# Altium footprint library Basal.PcbLib: 248 footprints (part 10 of 16)
Each footprint in its own frame and in the unit in brackets; x right, y up, seen from the top. Pads: shape width x height; smd on the part's side, far side on the other; paste and mask are expansions set on the pad; w line width, h text height; cw(c..) or ccw(c..) is an arc to the next point about the centre after c.
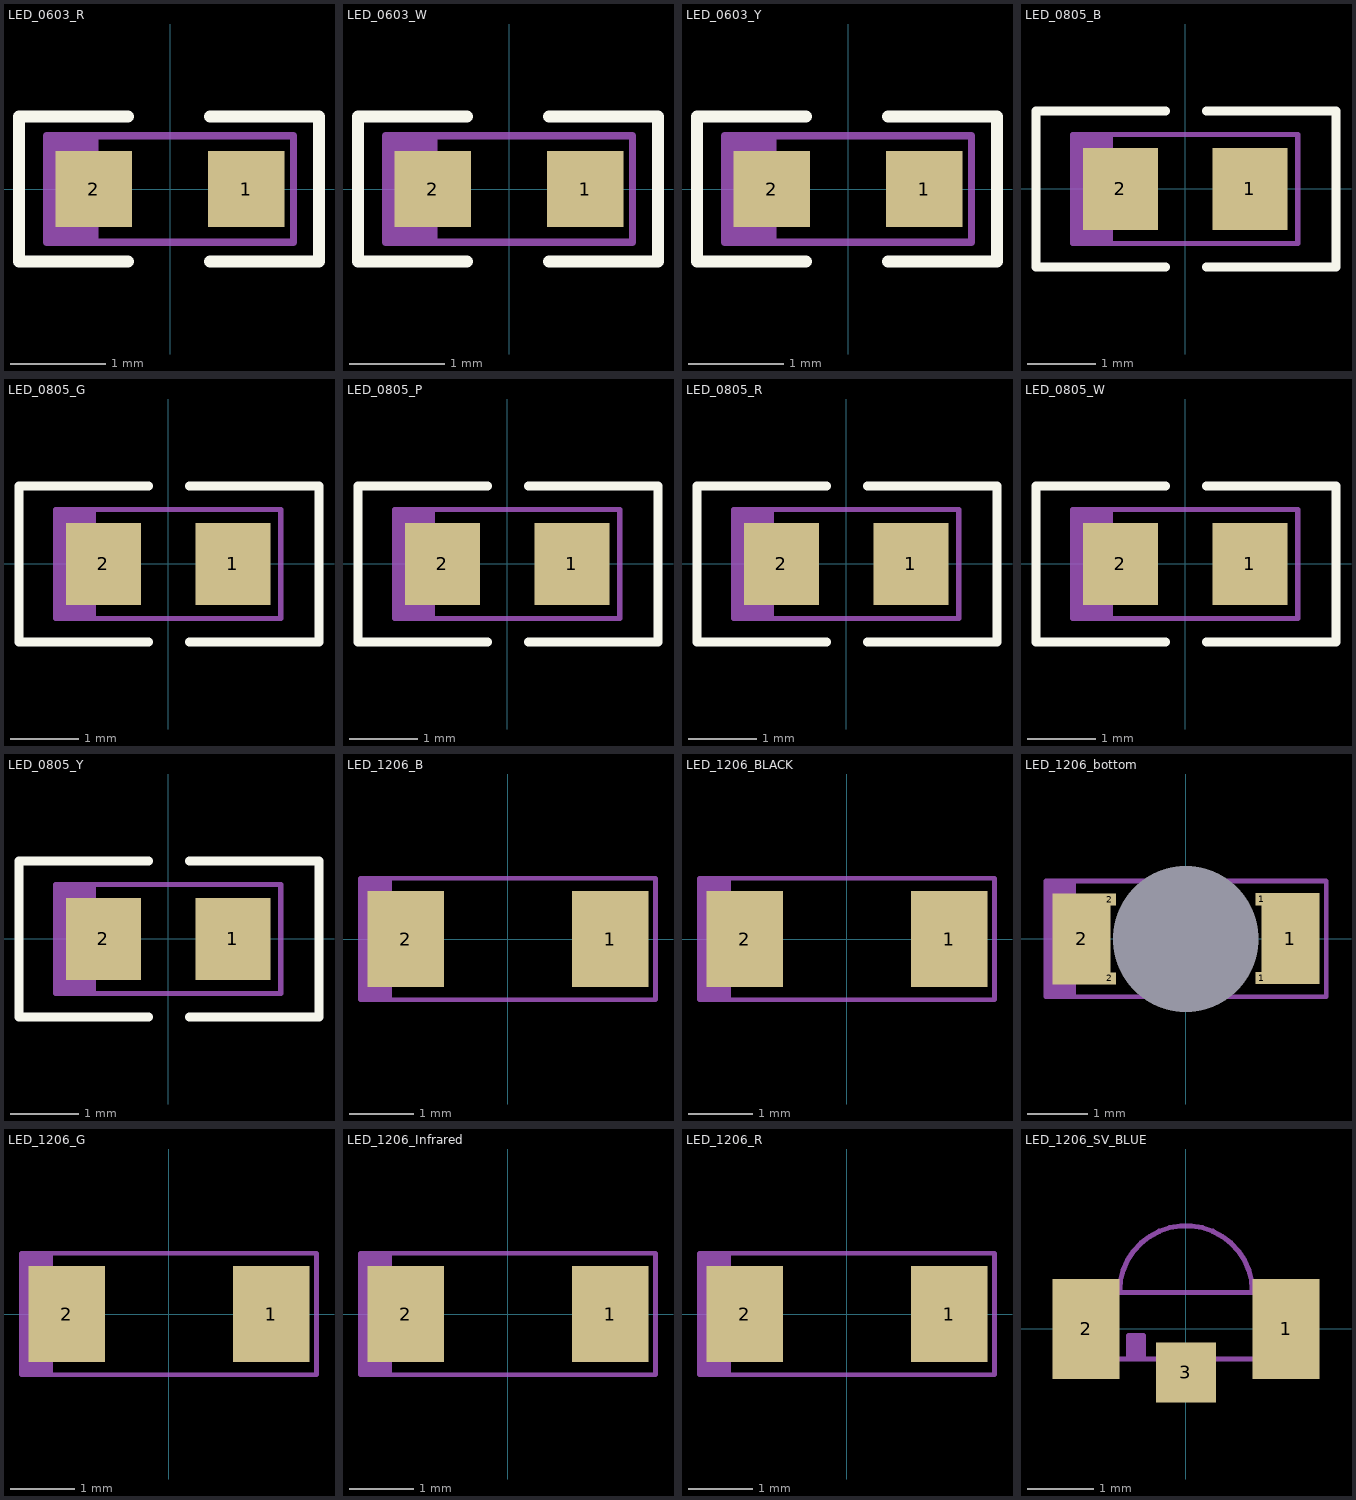
[diagram p9: the footprints below, top view; thin cyan lines are the x and y axes]

## LED_0603_R [mm] "红色贴片0603LED"
pads (2):
  rect 0.8x0.8 smd paste-1: 1(0.8,0) 2(-0.8,0)
Top Overlay:
  lines w0.127: -0.443,-0.762 -1.586,-0.762 -1.586,0.762 -0.443,0.762 ; 0.421,-0.762 1.564,-0.762 1.564,0.762 0.421,0.762
Top Paste:
  region: 0.419,0.15 0.719,0.368 1.169,0.368 1.169,-0.368 0.719,-0.368 0.419,-0.15
  region: -0.419,-0.15 -0.719,-0.368 -1.169,-0.368 -1.169,0.368 -0.719,0.368 -0.419,0.15
Mechanical 15:
  lines w0.076: -1.245,-0.559 -1.245,0.559 ; -1.194,-0.559 -1.194,0.559 ; -1.143,-0.559 -1.143,0.559 ; -1.092,-0.559 -1.092,0.559 ; -1.041,-0.559 -1.041,0.559 ; -0.991,-0.559 -0.991,0.559 ; -0.94,-0.559 -0.94,0.559 ; -0.889,-0.559 -0.889,0.559 ; -0.838,-0.559 -0.838,0.559 ; -0.787,-0.559 -0.787,0.559 ; -1.295,-0.559 -1.295,0.559 1.295,0.559 1.295,-0.559 -1.295,-0.559
3D body "RED0603.STEP": height 0.8, standoff 0, extent -0.8,-0.4 0.8,0.4

## LED_0603_W [mm] "白色贴片0603LED"
pads (2):
  rect 0.8x0.8 smd paste-1: 1(0.8,0) 2(-0.8,0)
Top Overlay:
  lines w0.127: -0.443,-0.762 -1.586,-0.762 -1.586,0.762 -0.443,0.762 ; 0.421,-0.762 1.564,-0.762 1.564,0.762 0.421,0.762
Top Paste:
  region: -0.419,-0.15 -0.719,-0.368 -1.169,-0.368 -1.169,0.368 -0.719,0.368 -0.419,0.15
  region: 0.419,0.15 0.719,0.368 1.169,0.368 1.169,-0.368 0.719,-0.368 0.419,-0.15
Mechanical 15:
  lines w0.076: -1.245,-0.559 -1.245,0.559 ; -1.194,-0.559 -1.194,0.559 ; -1.143,-0.559 -1.143,0.559 ; -1.092,-0.559 -1.092,0.559 ; -1.041,-0.559 -1.041,0.559 ; -0.991,-0.559 -0.991,0.559 ; -0.94,-0.559 -0.94,0.559 ; -0.889,-0.559 -0.889,0.559 ; -0.838,-0.559 -0.838,0.559 ; -0.787,-0.559 -0.787,0.559 ; -1.295,-0.559 -1.295,0.559 1.295,0.559 1.295,-0.559 -1.295,-0.559
3D body "WHITE0603.STEP": height 0.8, standoff 0, extent -0.8,-0.4 0.8,0.4

## LED_0603_Y [mm] "黄色贴片0603LED"
pads (2):
  rect 0.8x0.8 smd paste-1: 1(0.8,0) 2(-0.8,0)
Top Overlay:
  lines w0.127: -0.443,-0.762 -1.586,-0.762 -1.586,0.762 -0.443,0.762 ; 0.421,-0.762 1.564,-0.762 1.564,0.762 0.421,0.762
Top Paste:
  region: -0.419,-0.15 -0.719,-0.368 -1.169,-0.368 -1.169,0.368 -0.719,0.368 -0.419,0.15
  region: 0.419,0.15 0.719,0.368 1.169,0.368 1.169,-0.368 0.719,-0.368 0.419,-0.15
Mechanical 15:
  lines w0.076: -1.245,-0.559 -1.245,0.559 ; -1.194,-0.559 -1.194,0.559 ; -1.143,-0.559 -1.143,0.559 ; -1.092,-0.559 -1.092,0.559 ; -1.041,-0.559 -1.041,0.559 ; -0.991,-0.559 -0.991,0.559 ; -0.94,-0.559 -0.94,0.559 ; -0.889,-0.559 -0.889,0.559 ; -0.838,-0.559 -0.838,0.559 ; -0.787,-0.559 -0.787,0.559 ; -1.295,-0.559 -1.295,0.559 1.295,0.559 1.295,-0.559 -1.295,-0.559
3D body "YELLOW0603.STEP": height 0.8, standoff 0, extent -0.8,-0.4 0.8,0.4

## LED_0805_B [mm] "蓝色贴片0805LED"
pads (2):
  rect 1.1x1.2 smd paste-2: 1(0.95,0) 2(-0.95,0)
Top Overlay:
  lines w0.127: -0.282,-1.143 -2.187,-1.143 -2.187,1.143 -0.282,1.143 ; 0.307,-1.143 2.212,-1.143 2.212,1.143 0.307,1.143
Top Paste:
  region: 0.452,0.459 0.452,0.479 0.467,0.515 0.496,0.544 0.532,0.559 0.552,0.559 1.348,0.559 1.368,0.559 1.404,0.544 1.433,0.515 1.448,0.479 1.448,0.459 1.448,-0.459 1.448,-0.479 1.433,-0.515 1.404,-0.544 1.368,-0.559 1.348,-0.559 0.552,-0.559 0.532,-0.559 0.496,-0.544 0.467,-0.515 0.452,-0.479 0.452,-0.459 0.452,-0.3 0.452,-0.28 0.467,-0.243 0.496,-0.215 0.532,-0.2 0.552,-0.2 0.648,-0.2 0.687,-0.196 0.759,-0.166 0.814,-0.111 0.844,-0.039 0.844,0.039 0.814,0.111 0.759,0.166 0.687,0.196 0.648,0.2 0.552,0.2 0.532,0.2 0.496,0.215 0.467,0.243 0.452,0.28 0.452,0.3
  region: -0.452,-0.459 -0.452,-0.479 -0.467,-0.515 -0.496,-0.544 -0.532,-0.559 -0.552,-0.559 -1.348,-0.559 -1.368,-0.559 -1.404,-0.544 -1.433,-0.515 -1.448,-0.479 -1.448,-0.459 -1.448,0.459 -1.448,0.479 -1.433,0.515 -1.404,0.544 -1.368,0.559 -1.348,0.559 -0.552,0.559 -0.532,0.559 -0.496,0.544 -0.467,0.515 -0.452,0.479 -0.452,0.459 -0.452,0.3 -0.452,0.28 -0.467,0.243 -0.496,0.215 -0.532,0.2 -0.552,0.2 -0.648,0.2 -0.687,0.196 -0.759,0.166 -0.814,0.111 -0.844,0.039 -0.844,-0.039 -0.814,-0.111 -0.759,-0.166 -0.687,-0.196 -0.648,-0.2 -0.552,-0.2 -0.532,-0.2 -0.496,-0.215 -0.467,-0.243 -0.452,-0.28 -0.452,-0.3
Mechanical 15:
  lines w0.076: -1.6,-0.8 -1.6,0.8 ; -1.549,-0.8 -1.549,0.8 ; -1.499,-0.8 -1.499,0.8 ; -1.448,-0.8 -1.448,0.8 ; -1.397,-0.8 -1.397,0.8 ; -1.346,-0.8 -1.346,0.8 ; -1.295,-0.8 -1.295,0.8 ; -1.245,-0.8 -1.245,0.8 ; -1.194,-0.8 -1.194,0.8 ; -1.143,-0.8 -1.143,0.8 ; -1.092,-0.8 -1.092,0.8 ; -1.651,-0.8 1.651,-0.8 1.651,0.8 -1.651,0.8 -1.651,-0.8
3D body "BLUE0805.STEP": height 0.81, standoff 0.01, extent -0.987,-0.625 1.013,0.625

## LED_0805_G [mm] "绿色贴片0805LED"
pads (2):
  rect 1.1x1.2 smd paste-2: 1(0.95,0) 2(-0.95,0)
Top Overlay:
  lines w0.127: -0.282,-1.143 -2.187,-1.143 -2.187,1.143 -0.282,1.143 ; 0.307,-1.143 2.212,-1.143 2.212,1.143 0.307,1.143
Top Paste:
  region: 0.452,0.459 0.452,0.479 0.467,0.515 0.496,0.544 0.532,0.559 0.552,0.559 1.348,0.559 1.368,0.559 1.404,0.544 1.433,0.515 1.448,0.479 1.448,0.459 1.448,-0.459 1.448,-0.479 1.433,-0.515 1.404,-0.544 1.368,-0.559 1.348,-0.559 0.552,-0.559 0.532,-0.559 0.496,-0.544 0.467,-0.515 0.452,-0.479 0.452,-0.459 0.452,-0.3 0.452,-0.28 0.467,-0.243 0.496,-0.215 0.532,-0.2 0.552,-0.2 0.648,-0.2 0.687,-0.196 0.759,-0.166 0.814,-0.111 0.844,-0.039 0.844,0.039 0.814,0.111 0.759,0.166 0.687,0.196 0.648,0.2 0.552,0.2 0.532,0.2 0.496,0.215 0.467,0.243 0.452,0.28 0.452,0.3
  region: -0.452,-0.459 -0.452,-0.479 -0.467,-0.515 -0.496,-0.544 -0.532,-0.559 -0.552,-0.559 -1.348,-0.559 -1.368,-0.559 -1.404,-0.544 -1.433,-0.515 -1.448,-0.479 -1.448,-0.459 -1.448,0.459 -1.448,0.479 -1.433,0.515 -1.404,0.544 -1.368,0.559 -1.348,0.559 -0.552,0.559 -0.532,0.559 -0.496,0.544 -0.467,0.515 -0.452,0.479 -0.452,0.459 -0.452,0.3 -0.452,0.28 -0.467,0.243 -0.496,0.215 -0.532,0.2 -0.552,0.2 -0.648,0.2 -0.687,0.196 -0.759,0.166 -0.814,0.111 -0.844,0.039 -0.844,-0.039 -0.814,-0.111 -0.759,-0.166 -0.687,-0.196 -0.648,-0.2 -0.552,-0.2 -0.532,-0.2 -0.496,-0.215 -0.467,-0.243 -0.452,-0.28 -0.452,-0.3
Mechanical 15:
  lines w0.076: -1.6,-0.8 -1.6,0.8 ; -1.549,-0.8 -1.549,0.8 ; -1.499,-0.8 -1.499,0.8 ; -1.448,-0.8 -1.448,0.8 ; -1.397,-0.8 -1.397,0.8 ; -1.346,-0.8 -1.346,0.8 ; -1.295,-0.8 -1.295,0.8 ; -1.245,-0.8 -1.245,0.8 ; -1.194,-0.8 -1.194,0.8 ; -1.143,-0.8 -1.143,0.8 ; -1.092,-0.8 -1.092,0.8 ; -1.651,-0.8 -1.651,0.8 1.651,0.8 1.651,-0.8 -1.651,-0.8
3D body "GREEN0805.STEP": height 0.81, standoff 0.01, extent -1,-0.625 1,0.625

## LED_0805_P [mm] "紫色贴片0805LED"
pads (2):
  rect 1.1x1.2 smd paste-2: 1(0.95,0) 2(-0.95,0)
Top Overlay:
  lines w0.127: -0.282,-1.143 -2.187,-1.143 -2.187,1.143 -0.282,1.143 ; 0.307,-1.143 2.212,-1.143 2.212,1.143 0.307,1.143
Top Paste:
  region: 0.452,0.459 0.452,0.479 0.467,0.515 0.496,0.544 0.532,0.559 0.552,0.559 1.348,0.559 1.368,0.559 1.404,0.544 1.433,0.515 1.448,0.479 1.448,0.459 1.448,-0.459 1.448,-0.479 1.433,-0.515 1.404,-0.544 1.368,-0.559 1.348,-0.559 0.552,-0.559 0.532,-0.559 0.496,-0.544 0.467,-0.515 0.452,-0.479 0.452,-0.459 0.452,-0.3 0.452,-0.28 0.467,-0.243 0.496,-0.215 0.532,-0.2 0.552,-0.2 0.648,-0.2 0.687,-0.196 0.759,-0.166 0.814,-0.111 0.844,-0.039 0.844,0.039 0.814,0.111 0.759,0.166 0.687,0.196 0.648,0.2 0.552,0.2 0.532,0.2 0.496,0.215 0.467,0.243 0.452,0.28 0.452,0.3
  region: -0.452,-0.459 -0.452,-0.479 -0.467,-0.515 -0.496,-0.544 -0.532,-0.559 -0.552,-0.559 -1.348,-0.559 -1.368,-0.559 -1.404,-0.544 -1.433,-0.515 -1.448,-0.479 -1.448,-0.459 -1.448,0.459 -1.448,0.479 -1.433,0.515 -1.404,0.544 -1.368,0.559 -1.348,0.559 -0.552,0.559 -0.532,0.559 -0.496,0.544 -0.467,0.515 -0.452,0.479 -0.452,0.459 -0.452,0.3 -0.452,0.28 -0.467,0.243 -0.496,0.215 -0.532,0.2 -0.552,0.2 -0.648,0.2 -0.687,0.196 -0.759,0.166 -0.814,0.111 -0.844,0.039 -0.844,-0.039 -0.814,-0.111 -0.759,-0.166 -0.687,-0.196 -0.648,-0.2 -0.552,-0.2 -0.532,-0.2 -0.496,-0.215 -0.467,-0.243 -0.452,-0.28 -0.452,-0.3
Mechanical 15:
  lines w0.076: -1.6,-0.8 -1.6,0.8 ; -1.549,-0.8 -1.549,0.8 ; -1.499,-0.8 -1.499,0.8 ; -1.448,-0.8 -1.448,0.8 ; -1.397,-0.8 -1.397,0.8 ; -1.346,-0.8 -1.346,0.8 ; -1.295,-0.8 -1.295,0.8 ; -1.245,-0.8 -1.245,0.8 ; -1.194,-0.8 -1.194,0.8 ; -1.143,-0.8 -1.143,0.8 ; -1.092,-0.8 -1.092,0.8 ; -1.651,-0.8 1.651,-0.8 1.651,0.8 -1.651,0.8 -1.651,-0.8
3D body "PINK0805.STEP": height 0.81, standoff 0.01, extent -1,-0.625 1,0.625

## LED_0805_R [mm] "红色贴片0805LED"
pads (2):
  rect 1.1x1.2 smd paste-2: 1(0.95,0) 2(-0.95,0)
Top Overlay:
  lines w0.127: -0.282,-1.143 -2.187,-1.143 -2.187,1.143 -0.282,1.143 ; 0.307,-1.143 2.212,-1.143 2.212,1.143 0.307,1.143
Top Paste:
  region: 0.452,0.459 0.452,0.479 0.467,0.515 0.496,0.544 0.532,0.559 0.552,0.559 1.348,0.559 1.368,0.559 1.404,0.544 1.433,0.515 1.448,0.479 1.448,0.459 1.448,-0.459 1.448,-0.479 1.433,-0.515 1.404,-0.544 1.368,-0.559 1.348,-0.559 0.552,-0.559 0.532,-0.559 0.496,-0.544 0.467,-0.515 0.452,-0.479 0.452,-0.459 0.452,-0.3 0.452,-0.28 0.467,-0.243 0.496,-0.215 0.532,-0.2 0.552,-0.2 0.648,-0.2 0.687,-0.196 0.759,-0.166 0.814,-0.111 0.844,-0.039 0.844,0.039 0.814,0.111 0.759,0.166 0.687,0.196 0.648,0.2 0.552,0.2 0.532,0.2 0.496,0.215 0.467,0.243 0.452,0.28 0.452,0.3
  region: -0.452,-0.459 -0.452,-0.479 -0.467,-0.515 -0.496,-0.544 -0.532,-0.559 -0.552,-0.559 -1.348,-0.559 -1.368,-0.559 -1.404,-0.544 -1.433,-0.515 -1.448,-0.479 -1.448,-0.459 -1.448,0.459 -1.448,0.479 -1.433,0.515 -1.404,0.544 -1.368,0.559 -1.348,0.559 -0.552,0.559 -0.532,0.559 -0.496,0.544 -0.467,0.515 -0.452,0.479 -0.452,0.459 -0.452,0.3 -0.452,0.28 -0.467,0.243 -0.496,0.215 -0.532,0.2 -0.552,0.2 -0.648,0.2 -0.687,0.196 -0.759,0.166 -0.814,0.111 -0.844,0.039 -0.844,-0.039 -0.814,-0.111 -0.759,-0.166 -0.687,-0.196 -0.648,-0.2 -0.552,-0.2 -0.532,-0.2 -0.496,-0.215 -0.467,-0.243 -0.452,-0.28 -0.452,-0.3
Mechanical 15:
  lines w0.076: -1.6,-0.8 -1.6,0.8 ; -1.549,-0.8 -1.549,0.8 ; -1.499,-0.8 -1.499,0.8 ; -1.448,-0.8 -1.448,0.8 ; -1.397,-0.8 -1.397,0.8 ; -1.346,-0.8 -1.346,0.8 ; -1.295,-0.8 -1.295,0.8 ; -1.245,-0.8 -1.245,0.8 ; -1.194,-0.8 -1.194,0.8 ; -1.143,-0.8 -1.143,0.8 ; -1.092,-0.8 -1.092,0.8 ; -1.651,-0.8 -1.651,0.8 1.651,0.8 1.651,-0.8 -1.651,-0.8
3D body "RED0805.STEP": height 0.81, standoff 0.01, extent -1,-0.625 1,0.625

## LED_0805_W [mm] "白色贴片0805LED"
pads (2):
  rect 1.1x1.2 smd paste-2: 1(0.95,0) 2(-0.95,0)
Top Overlay:
  lines w0.127: -0.282,-1.143 -2.187,-1.143 -2.187,1.143 -0.282,1.143 ; 0.307,-1.143 2.212,-1.143 2.212,1.143 0.307,1.143
Top Paste:
  region: 0.452,0.459 0.452,0.479 0.467,0.515 0.496,0.544 0.532,0.559 0.552,0.559 1.348,0.559 1.368,0.559 1.404,0.544 1.433,0.515 1.448,0.479 1.448,0.459 1.448,-0.459 1.448,-0.479 1.433,-0.515 1.404,-0.544 1.368,-0.559 1.348,-0.559 0.552,-0.559 0.532,-0.559 0.496,-0.544 0.467,-0.515 0.452,-0.479 0.452,-0.459 0.452,-0.3 0.452,-0.28 0.467,-0.243 0.496,-0.215 0.532,-0.2 0.552,-0.2 0.648,-0.2 0.687,-0.196 0.759,-0.166 0.814,-0.111 0.844,-0.039 0.844,0.039 0.814,0.111 0.759,0.166 0.687,0.196 0.648,0.2 0.552,0.2 0.532,0.2 0.496,0.215 0.467,0.243 0.452,0.28 0.452,0.3
  region: -0.452,-0.459 -0.452,-0.479 -0.467,-0.515 -0.496,-0.544 -0.532,-0.559 -0.552,-0.559 -1.348,-0.559 -1.368,-0.559 -1.404,-0.544 -1.433,-0.515 -1.448,-0.479 -1.448,-0.459 -1.448,0.459 -1.448,0.479 -1.433,0.515 -1.404,0.544 -1.368,0.559 -1.348,0.559 -0.552,0.559 -0.532,0.559 -0.496,0.544 -0.467,0.515 -0.452,0.479 -0.452,0.459 -0.452,0.3 -0.452,0.28 -0.467,0.243 -0.496,0.215 -0.532,0.2 -0.552,0.2 -0.648,0.2 -0.687,0.196 -0.759,0.166 -0.814,0.111 -0.844,0.039 -0.844,-0.039 -0.814,-0.111 -0.759,-0.166 -0.687,-0.196 -0.648,-0.2 -0.552,-0.2 -0.532,-0.2 -0.496,-0.215 -0.467,-0.243 -0.452,-0.28 -0.452,-0.3
Mechanical 15:
  lines w0.076: -1.6,-0.8 -1.6,0.8 ; -1.549,-0.8 -1.549,0.8 ; -1.499,-0.8 -1.499,0.8 ; -1.448,-0.8 -1.448,0.8 ; -1.397,-0.8 -1.397,0.8 ; -1.346,-0.8 -1.346,0.8 ; -1.295,-0.8 -1.295,0.8 ; -1.245,-0.8 -1.245,0.8 ; -1.194,-0.8 -1.194,0.8 ; -1.143,-0.8 -1.143,0.8 ; -1.092,-0.8 -1.092,0.8 ; -1.651,-0.8 1.651,-0.8 1.651,0.8 -1.651,0.8 -1.651,-0.8
3D body "WHITE0805.STEP": height 0.81, standoff 0.01, extent -1,-0.625 1,0.625

## LED_0805_Y [mm] "黄色贴片0805LED"
pads (2):
  rect 1.1x1.2 smd paste-2: 1(0.95,0) 2(-0.95,0)
Top Overlay:
  lines w0.127: -0.282,-1.143 -2.187,-1.143 -2.187,1.143 -0.282,1.143 ; 0.307,-1.143 2.212,-1.143 2.212,1.143 0.307,1.143
Top Paste:
  region: -0.452,-0.459 -0.452,-0.479 -0.467,-0.515 -0.496,-0.544 -0.532,-0.559 -0.552,-0.559 -1.348,-0.559 -1.368,-0.559 -1.404,-0.544 -1.433,-0.515 -1.448,-0.479 -1.448,-0.459 -1.448,0.459 -1.448,0.479 -1.433,0.515 -1.404,0.544 -1.368,0.559 -1.348,0.559 -0.552,0.559 -0.532,0.559 -0.496,0.544 -0.467,0.515 -0.452,0.479 -0.452,0.459 -0.452,0.3 -0.452,0.28 -0.467,0.243 -0.496,0.215 -0.532,0.2 -0.552,0.2 -0.648,0.2 -0.687,0.196 -0.759,0.166 -0.814,0.111 -0.844,0.039 -0.844,-0.039 -0.814,-0.111 -0.759,-0.166 -0.687,-0.196 -0.648,-0.2 -0.552,-0.2 -0.532,-0.2 -0.496,-0.215 -0.467,-0.243 -0.452,-0.28 -0.452,-0.3
  region: 0.452,0.459 0.452,0.479 0.467,0.515 0.496,0.544 0.532,0.559 0.552,0.559 1.348,0.559 1.368,0.559 1.404,0.544 1.433,0.515 1.448,0.479 1.448,0.459 1.448,-0.459 1.448,-0.479 1.433,-0.515 1.404,-0.544 1.368,-0.559 1.348,-0.559 0.552,-0.559 0.532,-0.559 0.496,-0.544 0.467,-0.515 0.452,-0.479 0.452,-0.459 0.452,-0.3 0.452,-0.28 0.467,-0.243 0.496,-0.215 0.532,-0.2 0.552,-0.2 0.648,-0.2 0.687,-0.196 0.759,-0.166 0.814,-0.111 0.844,-0.039 0.844,0.039 0.814,0.111 0.759,0.166 0.687,0.196 0.648,0.2 0.552,0.2 0.532,0.2 0.496,0.215 0.467,0.243 0.452,0.28 0.452,0.3
Mechanical 15:
  lines w0.076: -1.6,-0.8 -1.6,0.8 ; -1.549,-0.8 -1.549,0.8 ; -1.499,-0.8 -1.499,0.8 ; -1.448,-0.8 -1.448,0.8 ; -1.397,-0.8 -1.397,0.8 ; -1.346,-0.8 -1.346,0.8 ; -1.295,-0.8 -1.295,0.8 ; -1.245,-0.8 -1.245,0.8 ; -1.194,-0.8 -1.194,0.8 ; -1.143,-0.8 -1.143,0.8 ; -1.092,-0.8 -1.092,0.8 ; -1.651,-0.8 1.651,-0.8 1.651,0.8 -1.651,0.8 -1.651,-0.8
3D body "YELLOW0805.STEP": height 0.81, standoff 0.01, extent -1,-0.625 1,0.625

## LED_1206_B [mm] "蓝色贴片1206LED"
height 0.55
pads (2):
  rect 1.2x1.5 smd paste-3: 1(1.6,0) 2(-1.6,0)
Top Paste:
  region: -1.051,-0.611 -1.051,-0.631 -1.066,-0.668 -1.094,-0.696 -1.131,-0.711 -1.151,-0.711 -2.049,-0.711 -2.069,-0.711 -2.106,-0.696 -2.134,-0.668 -2.149,-0.631 -2.149,-0.611 -2.149,0.611 -2.149,0.631 -2.134,0.668 -2.106,0.696 -2.069,0.711 -2.049,0.711 -1.151,0.711 -1.131,0.711 -1.094,0.696 -1.066,0.668 -1.051,0.631 -1.051,0.611 -1.051,0.35 -1.051,0.33 -1.066,0.293 -1.094,0.265 -1.131,0.25 -1.151,0.25 -1.25,0.25 -1.299,0.245 -1.389,0.208 -1.458,0.139 -1.495,0.049 -1.495,-0.049 -1.458,-0.139 -1.389,-0.208 -1.299,-0.245 -1.25,-0.25 -1.151,-0.25 -1.131,-0.25 -1.094,-0.265 -1.066,-0.293 -1.051,-0.33 -1.051,-0.35
  region: 1.051,0.611 1.051,0.631 1.066,0.668 1.094,0.696 1.131,0.711 1.151,0.711 2.049,0.711 2.069,0.711 2.106,0.696 2.134,0.668 2.149,0.631 2.149,0.611 2.149,-0.611 2.149,-0.631 2.134,-0.668 2.106,-0.696 2.069,-0.711 2.049,-0.711 1.151,-0.711 1.131,-0.711 1.094,-0.696 1.066,-0.668 1.051,-0.631 1.051,-0.611 1.051,-0.35 1.051,-0.33 1.066,-0.293 1.094,-0.265 1.131,-0.25 1.151,-0.25 1.25,-0.25 1.299,-0.245 1.389,-0.208 1.458,-0.139 1.495,-0.049 1.495,0.049 1.458,0.139 1.389,0.208 1.299,0.245 1.25,0.25 1.151,0.25 1.131,0.25 1.094,0.265 1.066,0.293 1.051,0.33 1.051,0.35
Mechanical 15:
  lines w0.076: -2.235,-0.953 -2.235,0.953 ; -2.159,-0.953 -2.159,0.953 ; -2.083,-0.953 -2.083,0.953 ; -2.007,-0.953 -2.007,0.953 ; -1.93,-0.953 -1.93,0.953 ; -1.854,-0.953 -1.854,0.953 ; -2.311,-0.953 -2.311,0.953 2.311,0.953 2.311,-0.953 -2.311,-0.953
3D body "LED 1206 BLUE.STEP": height 1.1, standoff 0, extent -1.6,-0.8 1.6,0.8

## LED_1206_BLACK [mm] "红色贴片1206LED"
height 0.55
pads (2):
  rect 1.2x1.5 smd paste-3: 1(1.6,0) 2(-1.6,0)
Top Paste:
  region: -1.051,-0.611 -1.051,-0.631 -1.066,-0.668 -1.094,-0.696 -1.131,-0.711 -1.151,-0.711 -2.049,-0.711 -2.069,-0.711 -2.106,-0.696 -2.134,-0.668 -2.149,-0.631 -2.149,-0.611 -2.149,0.611 -2.149,0.631 -2.134,0.668 -2.106,0.696 -2.069,0.711 -2.049,0.711 -1.151,0.711 -1.131,0.711 -1.094,0.696 -1.066,0.668 -1.051,0.631 -1.051,0.611 -1.051,0.35 -1.051,0.33 -1.066,0.293 -1.094,0.265 -1.131,0.25 -1.151,0.25 -1.25,0.25 -1.299,0.245 -1.389,0.208 -1.458,0.139 -1.495,0.049 -1.495,-0.049 -1.458,-0.139 -1.389,-0.208 -1.299,-0.245 -1.25,-0.25 -1.151,-0.25 -1.131,-0.25 -1.094,-0.265 -1.066,-0.293 -1.051,-0.33 -1.051,-0.35
  region: 1.051,0.611 1.051,0.631 1.066,0.668 1.094,0.696 1.131,0.711 1.151,0.711 2.049,0.711 2.069,0.711 2.106,0.696 2.134,0.668 2.149,0.631 2.149,0.611 2.149,-0.611 2.149,-0.631 2.134,-0.668 2.106,-0.696 2.069,-0.711 2.049,-0.711 1.151,-0.711 1.131,-0.711 1.094,-0.696 1.066,-0.668 1.051,-0.631 1.051,-0.611 1.051,-0.35 1.051,-0.33 1.066,-0.293 1.094,-0.265 1.131,-0.25 1.151,-0.25 1.25,-0.25 1.299,-0.245 1.389,-0.208 1.458,-0.139 1.495,-0.049 1.495,0.049 1.458,0.139 1.389,0.208 1.299,0.245 1.25,0.25 1.151,0.25 1.131,0.25 1.094,0.265 1.066,0.293 1.051,0.33 1.051,0.35
Mechanical 15:
  lines w0.076: -2.235,-0.953 -2.235,0.953 ; -2.159,-0.953 -2.159,0.953 ; -2.083,-0.953 -2.083,0.953 ; -2.007,-0.953 -2.007,0.953 ; -1.93,-0.953 -1.93,0.953 ; -1.854,-0.953 -1.854,0.953 ; -2.311,-0.953 2.311,-0.953 2.311,0.953 -2.311,0.953 -2.311,-0.953
3D body "LED 1206 RED.STEP": height 1.1, standoff 0, extent -1.6,-0.8 1.6,0.8

## LED_1206_bottom [mm]
pads (7):
  rect 0.2x0.2 smd: 1(1.246,-0.648) 1(1.246,0.652) 2(-1.254,-0.652) 2(-1.254,0.648)
  rect 0.95x1.5 smd: 1(1.721,0.002) 2(-1.721,-0.002)
  round 2.3 hole 2.4 unplated paste+0 mask+0: ""(-0.004,-0.003)
Mechanical 15:
  lines w0.076: -2.235,-0.952 -2.235,0.953 ; -2.159,-0.952 -2.159,0.953 ; -2.083,-0.952 -2.083,0.953 ; -2.007,-0.952 -2.007,0.953 ; -1.93,-0.952 -1.93,0.953 ; -1.854,-0.952 -1.854,0.953 ; -2.311,-0.952 2.311,-0.952 2.311,0.953 -2.311,0.953 -2.311,-0.952 ; -0.432,0 0.33,-0.762 0.33,0.762 -0.432,0
3D body "User Library-LED 1206 btm.step": height 0.2, standoff -0.38, extent -1.6,-0.8 1.6,0.8
3D body: height 0, standoff -1.6, extent -0.797,-0.798 0.797,0.798

## LED_1206_G [mm] "绿色贴片1206LED"
height 0.55
pads (2):
  rect 1.2x1.5 smd paste-3: 1(1.6,0) 2(-1.6,0)
Top Paste:
  region: -1.051,-0.611 -1.051,-0.631 -1.066,-0.668 -1.094,-0.696 -1.131,-0.711 -1.151,-0.711 -2.049,-0.711 -2.069,-0.711 -2.106,-0.696 -2.134,-0.668 -2.149,-0.631 -2.149,-0.611 -2.149,0.611 -2.149,0.631 -2.134,0.668 -2.106,0.696 -2.069,0.711 -2.049,0.711 -1.151,0.711 -1.131,0.711 -1.094,0.696 -1.066,0.668 -1.051,0.631 -1.051,0.611 -1.051,0.35 -1.051,0.33 -1.066,0.293 -1.094,0.265 -1.131,0.25 -1.151,0.25 -1.25,0.25 -1.299,0.245 -1.389,0.208 -1.458,0.139 -1.495,0.049 -1.495,-0.049 -1.458,-0.139 -1.389,-0.208 -1.299,-0.245 -1.25,-0.25 -1.151,-0.25 -1.131,-0.25 -1.094,-0.265 -1.066,-0.293 -1.051,-0.33 -1.051,-0.35
  region: 1.051,0.611 1.051,0.631 1.066,0.668 1.094,0.696 1.131,0.711 1.151,0.711 2.049,0.711 2.069,0.711 2.106,0.696 2.134,0.668 2.149,0.631 2.149,0.611 2.149,-0.611 2.149,-0.631 2.134,-0.668 2.106,-0.696 2.069,-0.711 2.049,-0.711 1.151,-0.711 1.131,-0.711 1.094,-0.696 1.066,-0.668 1.051,-0.631 1.051,-0.611 1.051,-0.35 1.051,-0.33 1.066,-0.293 1.094,-0.265 1.131,-0.25 1.151,-0.25 1.25,-0.25 1.299,-0.245 1.389,-0.208 1.458,-0.139 1.495,-0.049 1.495,0.049 1.458,0.139 1.389,0.208 1.299,0.245 1.25,0.25 1.151,0.25 1.131,0.25 1.094,0.265 1.066,0.293 1.051,0.33 1.051,0.35
Mechanical 15:
  lines w0.076: -2.235,-0.953 -2.235,0.953 ; -2.159,-0.953 -2.159,0.953 ; -2.083,-0.953 -2.083,0.953 ; -2.007,-0.953 -2.007,0.953 ; -1.93,-0.953 -1.93,0.953 ; -1.854,-0.953 -1.854,0.953 ; -2.311,-0.953 -2.311,0.953 2.311,0.953 2.311,-0.953 -2.311,-0.953
3D body "GREEN 1206 .STEP": height 1.1, standoff 0, extent -1.6,-0.8 1.6,0.8

## LED_1206_Infrared [mm] "红色贴片1206LED"
height 0.55
pads (2):
  rect 1.2x1.5 smd paste-3: 1(1.6,0) 2(-1.6,0)
Top Paste:
  region: -1.051,-0.611 -1.051,-0.631 -1.066,-0.668 -1.094,-0.696 -1.131,-0.711 -1.151,-0.711 -2.049,-0.711 -2.069,-0.711 -2.106,-0.696 -2.134,-0.668 -2.149,-0.631 -2.149,-0.611 -2.149,0.611 -2.149,0.631 -2.134,0.668 -2.106,0.696 -2.069,0.711 -2.049,0.711 -1.151,0.711 -1.131,0.711 -1.094,0.696 -1.066,0.668 -1.051,0.631 -1.051,0.611 -1.051,0.35 -1.051,0.33 -1.066,0.293 -1.094,0.265 -1.131,0.25 -1.151,0.25 -1.25,0.25 -1.299,0.245 -1.389,0.208 -1.458,0.139 -1.495,0.049 -1.495,-0.049 -1.458,-0.139 -1.389,-0.208 -1.299,-0.245 -1.25,-0.25 -1.151,-0.25 -1.131,-0.25 -1.094,-0.265 -1.066,-0.293 -1.051,-0.33 -1.051,-0.35
  region: 1.051,0.611 1.051,0.631 1.066,0.668 1.094,0.696 1.131,0.711 1.151,0.711 2.049,0.711 2.069,0.711 2.106,0.696 2.134,0.668 2.149,0.631 2.149,0.611 2.149,-0.611 2.149,-0.631 2.134,-0.668 2.106,-0.696 2.069,-0.711 2.049,-0.711 1.151,-0.711 1.131,-0.711 1.094,-0.696 1.066,-0.668 1.051,-0.631 1.051,-0.611 1.051,-0.35 1.051,-0.33 1.066,-0.293 1.094,-0.265 1.131,-0.25 1.151,-0.25 1.25,-0.25 1.299,-0.245 1.389,-0.208 1.458,-0.139 1.495,-0.049 1.495,0.049 1.458,0.139 1.389,0.208 1.299,0.245 1.25,0.25 1.151,0.25 1.131,0.25 1.094,0.265 1.066,0.293 1.051,0.33 1.051,0.35
Mechanical 15:
  lines w0.076: -2.235,-0.953 -2.235,0.953 ; -2.159,-0.953 -2.159,0.953 ; -2.083,-0.953 -2.083,0.953 ; -2.007,-0.953 -2.007,0.953 ; -1.93,-0.953 -1.93,0.953 ; -1.854,-0.953 -1.854,0.953 ; -2.311,-0.953 2.311,-0.953 2.311,0.953 -2.311,0.953 -2.311,-0.953
3D body "LED 1206 RED.STEP": height 1.1, standoff 0, extent -1.6,-0.8 1.6,0.8

## LED_1206_R [mm] "红色贴片1206LED"
height 0.55
pads (2):
  rect 1.2x1.5 smd paste-3: 1(1.6,0) 2(-1.6,0)
Top Paste:
  region: -1.051,-0.611 -1.051,-0.631 -1.066,-0.668 -1.094,-0.696 -1.131,-0.711 -1.151,-0.711 -2.049,-0.711 -2.069,-0.711 -2.106,-0.696 -2.134,-0.668 -2.149,-0.631 -2.149,-0.611 -2.149,0.611 -2.149,0.631 -2.134,0.668 -2.106,0.696 -2.069,0.711 -2.049,0.711 -1.151,0.711 -1.131,0.711 -1.094,0.696 -1.066,0.668 -1.051,0.631 -1.051,0.611 -1.051,0.35 -1.051,0.33 -1.066,0.293 -1.094,0.265 -1.131,0.25 -1.151,0.25 -1.25,0.25 -1.299,0.245 -1.389,0.208 -1.458,0.139 -1.495,0.049 -1.495,-0.049 -1.458,-0.139 -1.389,-0.208 -1.299,-0.245 -1.25,-0.25 -1.151,-0.25 -1.131,-0.25 -1.094,-0.265 -1.066,-0.293 -1.051,-0.33 -1.051,-0.35
  region: 1.051,0.611 1.051,0.631 1.066,0.668 1.094,0.696 1.131,0.711 1.151,0.711 2.049,0.711 2.069,0.711 2.106,0.696 2.134,0.668 2.149,0.631 2.149,0.611 2.149,-0.611 2.149,-0.631 2.134,-0.668 2.106,-0.696 2.069,-0.711 2.049,-0.711 1.151,-0.711 1.131,-0.711 1.094,-0.696 1.066,-0.668 1.051,-0.631 1.051,-0.611 1.051,-0.35 1.051,-0.33 1.066,-0.293 1.094,-0.265 1.131,-0.25 1.151,-0.25 1.25,-0.25 1.299,-0.245 1.389,-0.208 1.458,-0.139 1.495,-0.049 1.495,0.049 1.458,0.139 1.389,0.208 1.299,0.245 1.25,0.25 1.151,0.25 1.131,0.25 1.094,0.265 1.066,0.293 1.051,0.33 1.051,0.35
Mechanical 15:
  lines w0.076: -2.235,-0.953 -2.235,0.953 ; -2.159,-0.953 -2.159,0.953 ; -2.083,-0.953 -2.083,0.953 ; -2.007,-0.953 -2.007,0.953 ; -1.93,-0.953 -1.93,0.953 ; -1.854,-0.953 -1.854,0.953 ; -2.311,-0.953 2.311,-0.953 2.311,0.953 -2.311,0.953 -2.311,-0.953
3D body "LED 1206 RED.STEP": height 1.1, standoff 0, extent -1.6,-0.8 1.6,0.8

## LED_1206_SV_BLUE [mm]
pads (3):
  rect 1x1.5 smd: 1(1.5,0) 2(-1.5,0)
  rect 0.9x0.9 smd: 3(0,-0.65)
Mechanical 15:
  lines w0.076: -1,0.55 cw(c0,0.55) 1,0.55 ; -0.787,-0.406 -0.787,-0.102 ; -0.711,-0.406 -0.711,-0.102 ; -1.5,-0.45 -1.5,0.55 1.5,0.55 1.5,-0.45 -1.5,-0.45 ; -0.864,-0.406 -0.864,-0.102 -0.635,-0.102 -0.635,-0.406 -0.864,-0.406
3D body "SW3dPS-APA3010GCCK_BLUE.STEP": height 0.98, standoff -0.01, extent -1.5,-0.456 1.5,1.544